# Altium integrated library EFR_Lib.IntLib: 430 symbols (part 3 of 6) (continued)
## LAA710S
designator U?
Double Solid State Relays - PCB Mount Single Pole OptoMOS 1-Form-A, 60V, 1A; Manufacturer: IXYS SEMICONDUCTOR; Height (mm): 4.572; Manufacturer P/N: LAA710S; ComponentLink1Description: Datasheet; ComponentLink1URL: https://www.mouser.de/datasheet/2/240/LAA710-1547779.pdf; Mounting Technology: SMT
footprint SOP254P952X457-8N
part A pins: 1 A, 2 K, 7 S', 8 S
part B pins: 3 A, 4 K, 5 S', 6 S

## LCA710R
designator U?
Solid State Relays - PCB Mount Single Pole OptoMOS 1-Form-A, 60V, 1A; Manufacturer: Ixys Clare; Isolation Voltage: 3.75kV; Case/Pakage: SMD DIP-6; Input Current: 50mA; Onstate Resistance: 500mR; Packageing: Rail/Tube; Load Current: 1A; Lead Free: Lead Free; Manufacturer P/N: LCA710R; Category: Solid State Relais; Max Operating Temp.: 85°; Max Output Voltage: 60V; Min Operating Temp.: -40°; Mounting Technology: SMT; Output Current: 1A; ComponentLink1Description: Maufacturer; ComponentLink1URL: https://www.mouser.de/ProductDetail/IXYS-Integrated-Circuits/LCA710STR?qs=sGAEpiMZZMsUriz2CNI3E0bxyj4gwKaXQYju9WODtmI%3D; ComponentLink2Description: Datasheet; ComponentLink2URL: https://datasheet.ciiva.com/15711/3lca710-15711264.pdf?src-supplier=Onlinecomponents.com; Supplier 1: Mouser; Supplier Part Number 1: 849-LCA710R; Supplier 2: Mouser; Supplier Part Number 2: 849-LCA710RTR
footprint DIP-6_SMD (Footprint not found)
pins: 1 A, 2 K, 3 NC, 4 S', 5 DC, 6 S

## LDK120C33R
designator U?
Linear Voltage Regulator IC 1 Output 200mA SOT-323-5; Manufacturer: STMicroelectronics; Pin Number: 5; Package: SOT-323 STMicroelectronics; Manufacturer P/N: LDK120C33R; ComponentLink1Description: Website; ComponentLink1URL: https://www.st.com/en/power-management/ldk120.html; ComponentLink2Description: Datasheet; ComponentLink2URL: https://www.st.com/resource/en/datasheet/ldk120.pdf; ComponentLink3Description: SnapEDA; ComponentLink3URL: https://www.snapeda.com/parts/LDK120C33R/STMicroelectronics/view-part/1196875/?ref=snap; Mounting Technology: SMT; Supplier 1: Mouser; Supplier Part Number 1: 511-LDK120C33R; Parameter 5: *
footprint SOT65P210X110-5N
pins: 1 IN (in), 2 GND (power), 3 EN (in), 4 BYPM/ADJINC (in), 5 OUT (out)

## LI24_1A85
designator K?, comment LI25-1A85
Reed Relays 100 W 1A 24VDC A NO 1000V; Manufacturer: MEDER electronic (Standex); Manufacturer P/N: LI24-1A85; Pin Number: 4; Mounting Technology: THT; Supplier 1: Mouser; Supplier Part Number 1: 876-LI24-1A85
footprint LI12-1A85
pins: 0 HV-in, 1 HV-out, 2 coil-in, 3 coil-out

## LM397MFX
designator U?
Single General Purpose Voltage Comparator, 5-pin SOT-23; Manufacturer: National Semiconductor; PowerWise: N; PackageTopMarking: C397*XTT; Pin Number: 5; RevisionNote: Component URLs added; PackageReference: MF05A; PackageDescription: Molded SOT-23, .115 x .063 x .040 in Body, 5 Lead, .0375 in Pitch; ComponentLink2Description: LM397 Web Page; ComponentLink2URL: http://www.national.com/pf/LM/LM397.html; DatasheetVersion: Aug-2006; PackageVersion: revD, Aug-2008; ComponentLink3Description: MF05A Package Page; ComponentLink1Description: LM397 Datasheet; ComponentLink1URL: http://www.national.com/ds/LM/LM397.pdf; RoHS: N; CompType: Comparator; ComponentLink3URL: http://www.national.com/packaging/folders/mf05a.html; Manufacturer P/N: LM397MFX; Mounting Technology: SMT
footprint MF05A_M (SOT23, 5-Leads, Body 2.9x1.6mm, Pitch 0.95mm, Lead Span 2.8mm, IPC Low Density)
pins: 1 IN- (in), 2 GND (power), 3 IN+ (in), 4 OUT (out), 5 VS (power)

## LM2776
designator U?
LM2776 Switched Capacitor Inverter; Manufacturer P/N: LM2776DBVR; Manufacturer: Texas Instruments; Pin Number: 6; ComponentLink1Description: Datasheet (Online); ComponentLink1URL: http://www.ti.com/lit/ds/symlink/lm2776.pdf; ComponentLink2Description: Datasheet (Local); ComponentLink2URL: ..\Datasheet\Texas_Instruments\lm2776.pdf; ComponentLink3Description: Datasheet (SVN); ComponentLink3URL: https://teamsvn.elbflorace.de/00_Bibliothek/Libraries/Altium/AltiumLibs/Datasheet/Texas_Instruments/lm2776.pdf; ComponentLink4Description: Manufacturer-Site; ComponentLink4URL: http://www.ti.com/product/LM2776; Package: SOT-23; Mounting Technology: SMT
footprint SOT23-6_N
footprint SOT23-6_M
footprint SOT23-6_L
3D model SOT-23 (PCB3D Model)
pins: 1 VOUT (power) "Negative voltage output", 2 GND (power) "Power supply ground input.", 3 VIN (power) "Power supply positive voltage input", 4 EN (in) "Enable control pin, tie this pin high (EN = 1) for normal operation,and to GND(EN= 0) for shutdown", 5 C1+ "Connect this pin to the positive terminal of the charge-pump capacitor.", 6 C1- "Connect this pin to the negative terminal of the charge-pump capacitor."

## LM3407
designator U?
LM3407350-mA,ConstantCurrentOutputFloatingBuck SwitchingConverterfor High-PowerLEDs; Manufacturer: Texas Instruments; Manufacturer P/N: LM3407MY/NOPB; Pin Number: 8; ComponentLink1Description: Datasheet; ComponentLink1URL: http://www.ti.com/lit/ds/symlink/lm3407.pdf; ComponentLink2Description: Manufacturer; ComponentLink2URL: http://www.ti.com/product/LM3407; ComponentLink3Description: Package Description; ComponentLink3URL: http://www.ti.com/lit/ml/mpds046e/mpds046e.pdf; Mounting Technology: SMT
footprint S-PDSO-G8_N (TI PowerPAD TM Plastic small outline)
footprint S-PDSO-G8_M (TI PowerPAD TM Plastic small outline)
footprint S-PDSO-G8_L (TI PowerPAD TM Plastic small outline)
pins: 1 ISNS "Connect resistor RISNS from this pin to ground for LED current sensing. The current sensing resistor should be placed close to this pin.", 2 DIM "PWM Dimming Control Pin. Applying a logic level PWM signal to this pin controls the intended brightness of the LED string.", 3 EN "Applying logic high to this pin or leaving it openenables the switcher. When pulled low the switcher is disabled and will enter low power shutdown mode", 4 FS "Switching Frequency Setting Pin. Connect resistor RFS from this pin to ground to set the switching frequency.", 5 VIN "Input Voltage Pin. The input voltage should be in the range of 4.5 V to 30 V", 6 VCC "Internal Regulator Output Pin. This pin should be bypassed to ground by a ceramic capacitor with a minimum value of 1 μF.", 7 GND "This pin should be connected to the system ground.", 8 LX "Drain of N-MOSFET Switch. Connect this pin to the output inductor and anode of the Schottky diode.", 9 EP "Thermal Pad (Power Ground). Used to dissipate heat from the package during operation. Must be electrically connected to GND external to the package."

## LMC555
designator U?  Manufacturer P/N: LMC555
Timer CMOS; Manufacturer: Texas Instruments; Rev: =VersionControl_RevNumber; ComponentLink1Description: Datasheet; ComponentLink1URL: http://www.ti.com/lit/ds/symlink/lmc555.pdf; ComponentLink2Description: Manufacturer; ComponentLink2URL: http://www.ti.com/product/LMC555; Mounting Technology: SMT
footprint SOIC-08
pins: 1 GND (power), 2 Trigger (in) "Responsible for transition of the flip-flop from set to reset. The output of the timer depends on the amplitude of the external trigger pulse applied to this pin", 3 Output (out) "Output driven waveform", 4 Reset (in) "Negative pulse applied to this pin to disable or reset the timer. When not used for reset purposes, it should be connected to VCC to avoid false triggering", 5 Control (in) "Control voltage controls the threshold and trigger levels. It determines the pulse width of the output waveform. An external voltage applied to this pin can also be used to modulate the output waveform", 6 Threshold (in) "Compares the voltage applied to the terminal with a reference voltage of 2/3 Vcc. The amplitude of voltage applied to this terminal is responsible for the set state of the flip-flop", 7 Discharge (oc) "Open collector output which discharges a capacitor between intervals (in phase with output). It toggles the output from high to low when voltage reaches 2/3 of the supply voltage", 8 V+ (power)

## LT1167AIS8
designator U?
Single Channel, Precision Operational Amplifier, Low Bias Current IA, 1 MHz Typical GBW, 1.2 V/us Typical SR, 4.6 to 40 V, 8-Pin SOIC (S8-8), Industrial, Pb-Free; Linear Technology Part Number: LT1167; Manufacturer P/N: LT1167AIS8#PBF; Manufacturer: Linear Technology; Is (mA) Typical: 0.9; Channels (#): 1; Vos (mV) Typical: 0.015; Vs Min (V): 4.6; SR (V/us) Typical: 1.2; Vs Max (V): 40; ComponentLink1Description: Manufacturer URL; ComponentLink2Description: Datasheet; RevisionNote: URLs updated; PackageDescription: 8-Pin Plastic Small Outline, Body 4.9 x 3.9 mm, Pitch 1.27 mm; ComponentLink2URL: https://cds.linear.com/docs/en/datasheet/1167fc.pdf; DatasheetVersion: Rev. C; ComponentLink3Description: Package Specification; ComponentLink3URL: https://cds.linear.com/docs/en/packaging/05081610_G_SO8.pdf; PackageVersion: Rev G; PackageReference: LT-S8-8; Mounting Technology: SMT; ComponentLink1URL: https://www.analog.com/en/products/lt1167.html; GBW (MHz) Typical: 1; Type: IA; RoHS: Pb-Free
footprint SOIC-8_L (R_8_ADI)
footprint SOIC-8_N (R_8_ADI)
footprint SOIC-8_M (R_8_ADI)
pins: 1 RG, 2 -IN (in), 3 +IN (in), 4 -VS (power), 5 REF (in), 6 OUTPUT (out), 7 +VS (power), 8 RG

## LT1819IS8
designator IC?
single/dual wide bandwidth, high / slew rate, low noise and distortion operational amplifi ers / with excellent DC performance; Manufacturer: Linear Technology; Manufacturer P/N: LT1819IS8#PBF; Datasheet Link: http://www.farnell.com/datasheets/1692381.pdf; Height: 1.752mm; Supplier Part Number 1: 584-LT1819IS8#PBF; Supplier 1: Mouser; Mounting Technology: SMT
footprint SOIC127P599X175-8N
pins: 1 OUT_A, 2 -IN_A, 3 +IN_A, 4 V-, 5 +IN_B, 6 -IN_B, 7 OUT_B, 8 V+

## LT6015MPS5
designator U?, comment LT6015
Low Power, Over-The-Top / Precision Op Amps / 3.2MHz, 0.8V/μs; Manufacturer: Analog Devices / Linear Technology; Manufacturer P/N: LT6015MPS5; Pin Number: 23; Bandwidth: 3.3MHz; Number of Circuits: 1; Input Bias Current: 2nA; Input Offset Voltage (Vos): 55uV; Operating Supply Current: 325uA; Output Current per Channel: 32mA; ComponentLink1Description: Manufacturer; ComponentLink1URL: https://www.analog.com/en/products/lt6016.html; ComponentLink2Description: Datasheet; ComponentLink2URL: https://www.analog.com/media/en/technical-documentation/data-sheets/601567ff.pdf; Supplier 1: Digi-Key; RoHS: Yes; Category: Amplifiers - Op Amps, Buffer, Instrumentation; Stock 1: 3303; Pricing 1: 1=7,42000, 10=6,70000, 25=6,38880, 100=5,54720, 250=5,29788 (USD); Mounting Technology: SMT; Case/Package: SOT-23-5; Min Operating Temperature: -55°C; Max Operating Temperature: 150°C; Slew Rate: 0.8V/µs; Package Quantity: 500; Packaging: Tape and Reel; Gain Bandwidth Product: 3.3MHz; Number of Amplifiers: 1; RoHS Compliant: Yes; REACH SVHC: No SVHC; Supplier Part Number 1: LT6015MPS5#TRMPBFCT-ND
footprint TSOT-23_L
footprint TSOT-23_N
footprint TSOT-23_M
footprint TSOT-23_MFG
part A pins: 1 OUT (out), 3 +IN (in), 4 -IN (in)
part B pins: 2 V- (power), 5 V+ (power)

## LT6016IMS8
designator U?, comment LT6016
Low Power, Over-The-Top / Precision Op Amps / 3.2MHz, 0.8V/μs; Manufacturer: Analog Devices / Linear Technology; Manufacturer P/N: LT6016IMS8#PBF; Pin Number: 8; Common Mode Rejection Ratio: 100dB; Max Supply Voltage: 50V; Min Supply Voltage: 3V; Min Dual Supply Voltage: 1.5V; Max Dual Supply Voltage: 15V; Number of Elements: 2; Input Offset Voltage (Vos): 50uV; Voltage Gain: 129.54dB; Power Supply Rejection Ratio (PSRR): 110dB; Nominal Supply Current: 315uA; ComponentLink1Description: Manufacturer; ComponentLink1URL: https://www.analog.com/en/products/lt6016.html; ComponentLink2Description: Datasheet; ComponentLink2URL: https://www.analog.com/media/en/technical-documentation/data-sheets/601567ff.pdf; Supplier 1: RSComponents; RoHS: Yes; Category: Amplifiers - Op Amps, Buffer, Instrumentation; Stock 1: 1; Pricing 1: 2=6,30600, 26=4,19000 (USD); Mounting Technology: SMT; Case/Package: MSOP; Min Operating Temperature: -40°C; Max Operating Temperature: 85°C; Package Quantity: 50; Series: *; Technology: BIPOLAR; Supply Current: 315uA; RoHS Compliant: Yes; Lead Free: Lead Free; Supplier Part Number 1: 8516878P
footprint MSOP_8 _L (ADI-RM) (SOP, 8-Leads, Body 3x3mm, Pitch 0.65mm, IPC High Density)
footprint MSOP_8 _N (ADI-RM) (SOP, 8-Leads, Body 3x3mm, Pitch 0.65mm, IPC Medium Density)
footprint MSOP_8 _M (ADI-RM) (SOP, 8-Leads, Body 3x3mm, Pitch 0.65mm, IPC Low Density)
part A pins: 1 OUTA (out), 2 -INA (in), 3 +INA (in)
part B pins: 5 +INB (in), 6 -INB (in), 7 OUTB (out)
part C pins: 4 V- (power), 8 V+ (power)

## LTC2054HS5
designator U?
Single Micropower Zero-Drift Operational Amplifiers; Manufacturer: Analog Devices; Pin Number: 5; Package: SOT-5 Analog Devices; Manufacturer P/N: LTC2054HS5; ComponentLink1Description: Website; ComponentLink1URL: https://www.analog.com/en/products/ltc2054.html; ComponentLink2Description: Datasheet; ComponentLink2URL: https://www.analog.com/media/en/technical-documentation/data-sheets/20545fc.pdf; ComponentLink3Description: SnapEDA; ComponentLink3URL: https://www.snapeda.com/parts/LTC2054HS5%23TRMPBF/Analog+Devices/view-part/?ref=snap; Mounting Technology: SMT; Supplier 1: Mouser; Supplier Part Number 1: 584-LTC2054HS5#TRPBF; Supplier 2: Mouser; Supplier Part Number 2: 584-LTC2054HS5TRMPBF
footprint TSOT-23_L
footprint TSOT-23_N
footprint TSOT-23_M
footprint TSOT-23_MFG
part A pins: 1 OUT (out) "Output", 3 + (in) "Input", 4 - (in) "Input"
part B pins: 2 V- (power) "Ground", 5 V+ (power) "Power terminal"

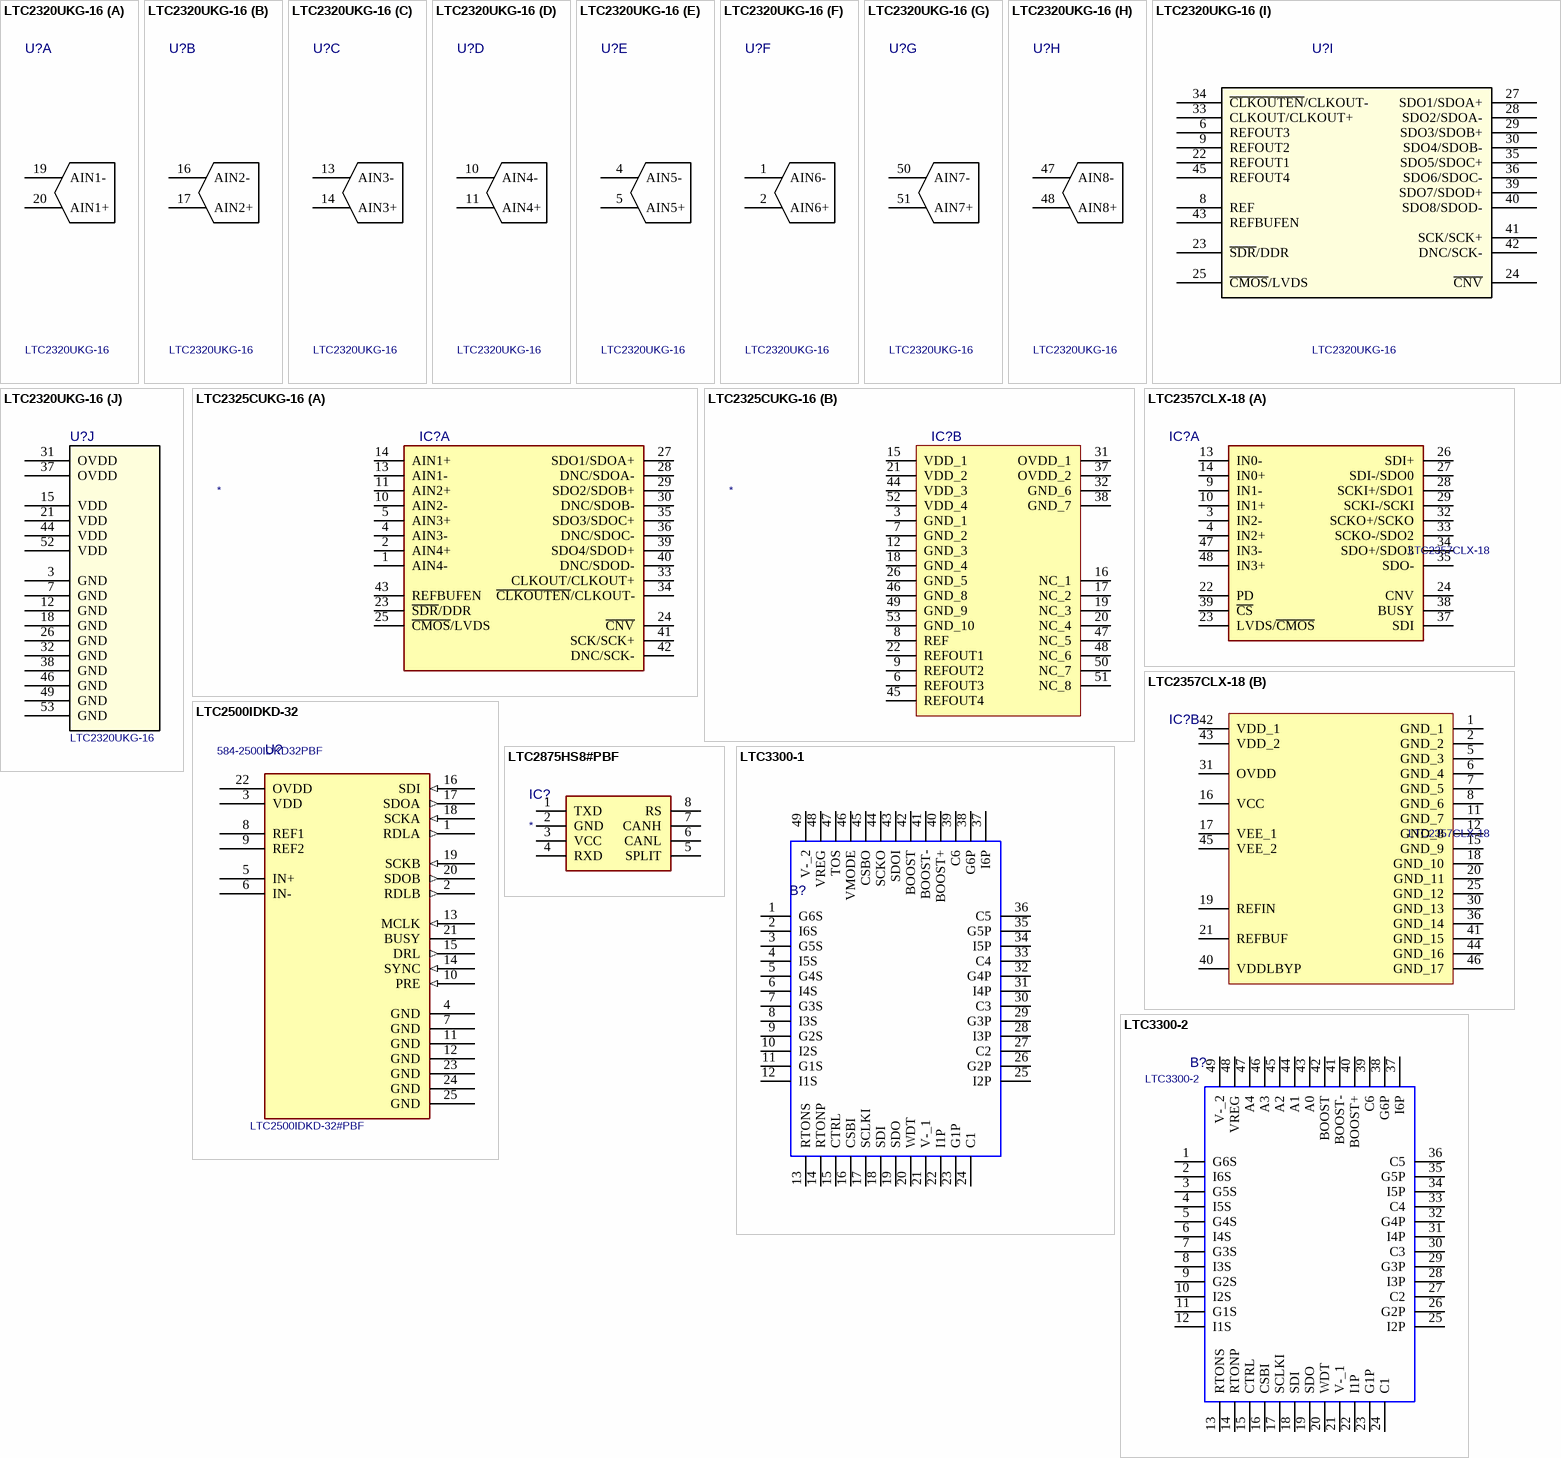
[diagram p13: symbols LTC2320UKG-16 to LTC3300-2]

## LTC2320UKG-16
designator U?
Octal, 16-Bit, 1.5Msps/Ch Simultaneous Sampling ADC; Manufacturer P/N: LTC2320IUKG-16#PBF; Manufacturer: Analog Devices Inc; Mounting Technology: SMT
footprint QFN_52_UKG_L
footprint QFN_52_UKG_N
footprint QFN_52_UKG_M
part A pins: 19 AIN1-, 20 AIN1+
part B pins: 16 AIN2-, 17 AIN2+
part C pins: 13 AIN3-, 14 AIN3+
part D pins: 10 AIN4-, 11 AIN4+
part E pins: 4 AIN5-, 5 AIN5+
part F pins: 1 AIN6-, 2 AIN6+
part G pins: 50 AIN7-, 51 AIN7+
part H pins: 47 AIN8-, 48 AIN8+
part I pins: 6 REFOUT3, 8 REF, 9 REFOUT2, 22 REFOUT1, 23 ~{SDR}/DDR, 24 ~{CNV}, 25 ~{CMOS}/LVDS, 27 SDO1/SDOA+, 28 SDO2/SDOA-, 29 SDO3/SDOB+, 30 SDO4/SDOB-, 33 CLKOUT/CLKOUT+, 34 ~{CLKOUTEN}/CLKOUT-, 35 SDO5/SDOC+, 36 SDO6/SDOC-, 39 SDO7/SDOD+, 40 SDO8/SDOD-, 41 SCK/SCK+, 42 DNC/SCK-, 43 REFBUFEN, 45 REFOUT4
part J pins: 3 GND, 7 GND, 12 GND, 15 VDD, 18 GND, 21 VDD, 26 GND, 31 OVDD, 32 GND, 37 OVDD, 38 GND, 44 VDD, 46 GND, 49 GND, 52 VDD, 53 GND

## LTC2325CUKG-16
designator IC?
low noise, high speed quad 16-bit / successive approximation register (SAR) ADC with / differential inputs and wide input common mode range.; Manufacturer: Analog Devices; Manufacturer P/N: LTC2325CUKG-16#PBF; Datasheet Link: https://www.analog.com/media/en/technical-documentation/data-sheets/232516fa.pdf; Height: 0.8mm; Mouser Part Number: 584-2325CUKG16PBF; Mouser Price/Stock: https://www.mouser.com/Search/Refine.aspx?Keyword=584-2325CUKG16PBF; Mounting Technology: SMT
footprint QFN50P700X800X80-53N-D
part A pins: 1 AIN4-, 2 AIN4+, 4 AIN3-, 5 AIN3+, 10 AIN2-, 11 AIN2+, 13 AIN1-, 14 AIN1+, 23 ~{SDR}/DDR, 24 ~{CNV}, 25 ~{CMOS}/LVDS, 27 SDO1/SDOA+, 28 DNC/SDOA-, 29 SDO2/SDOB+, 30 DNC/SDOB-, 33 CLKOUT/CLKOUT+, 34 ~{CLKOUTEN}/CLKOUT-, 35 SDO3/SDOC+, 36 DNC/SDOC-, 39 SDO4/SDOD+, 40 DNC/SDOD-, 41 SCK/SCK+, 42 DNC/SCK-, 43 REFBUFEN
part B pins: 3 GND_1, 6 REFOUT3, 7 GND_2, 8 REF, 9 REFOUT2, 12 GND_3, 15 VDD_1, 16 NC_1, 17 NC_2, 18 GND_4, 19 NC_3, 20 NC_4, 21 VDD_2, 22 REFOUT1, 26 GND_5, 31 OVDD_1, 32 GND_6, 37 OVDD_2, 38 GND_7, 44 VDD_3, 45 REFOUT4, 46 GND_8, 47 NC_5, 48 NC_6, 49 GND_9, 50 NC_7, 51 NC_8, 52 VDD_4, 53 GND_10

## LTC2357CLX-18
designator IC?
18-bit, low noise 4-channel / simultaneous sampling successive approximation register (SAR) ADC with buffered differential, wide common mode range picoamp inputs; Manufacturer: Analog Devices; Manufacturer P/N: LTC2357CLX-18#PBF; Height (mm): 1.6; Supplier Part Number 1: 584-LTC2357CLX-18PBF; Mounting Technology: SMT; Supplier 1: Mouser; ComponentLink1Description: Datasheet; ComponentLink1URL: https://www.mouser.com/datasheet/2/609/235718f-1266978.pdf
footprint QFP50P900X900X160-48N
part A pins: 3 IN2-, 4 IN2+, 9 IN1-, 10 IN1+, 13 IN0-, 14 IN0+, 22 PD, 23 LVDS/~{CMOS}, 24 CNV, 26 SDI+, 27 SDI-/SDO0, 28 SCKI+/SDO1, 29 SCKI-/SCKI, 32 SCKO+/SCKO, 33 SCKO-/SDO2, 34 SDO+/SDO3, 35 SDO-, 37 SDI, 38 BUSY, 39 ~{CS}, 47 IN3-, 48 IN3+
part B pins: 1 GND_1, 2 GND_2, 5 GND_3, 6 GND_4, 7 GND_5, 8 GND_6, 11 GND_7, 12 GND_8, 15 GND_9, 16 VCC, 17 VEE_1, 18 GND_10, 19 REFIN, 20 GND_11, 21 REFBUF, 25 GND_12, 30 GND_13, 31 OVDD, 36 GND_14, 40 VDDLBYP, 41 GND_15, 42 VDD_1, 43 VDD_2, 44 GND_16, 45 VEE_2, 46 GND_17

## LTC2500IDKD-32
designator U?, comment LTC2500IDKD-32#PBF  Supplier Part Number 1: 584-2500IDKD32PBF
1-Channel Single ADC SAR 1Msps 32-bit Serial 24-Pin DFN EP Tube; Manufacturer: Linear Technology; RoHS Compliant: Yes; Supplier 1: Mouser; Manufacturer P/N: LTC2500IDKD-32#PBF; RoHS: Yes; Category: Analog to Digital Converters (ADCs); Stock 1: 2; Pricing 1: 1=79,85000, 10=75,86000, 50=73,86000, 100=73,86000, 1000=73,86000, 10000=73,86000 (USD); ComponentLink1URL: http://www.analog.com/media/en/technical-documentation/data-sheets/250032fb.pdf?src-supplier=Digi-Key; ComponentLink1Description: http://www.analog.com/media/en/technical-documentation/data-sheets/250032fb.pdf?src-supplier=Digi-Key; ComponentLink2Description: Manufacturer; ComponentLink2URL: https://www.analog.com/en/products/ltc2500-32.html; ComponentLink3Description: Datasheet; ComponentLink3URL: https://www.analog.com/media/en/technical-documentation/data-sheets/250032fb.pdf; Mounting Technology: SMT
footprint DFN-24_M (DKD Package 24 Lead Plastic DFN (7mmx4mm))
pins: 1 RDLA (out), 2 RDLB (out), 3 VDD (power), 4 GND (power), 5 IN+ (hiz), 6 IN- (hiz), 7 GND (power), 8 REF1, 9 REF2, 10 PRE (in), 11 GND (power), 12 GND (power), 13 MCLK (in), 14 SYNC (in), 15 DRL (out), 16 SDI (in), 17 SDOA (out), 18 SCKA (in), 19 SCKB (in), 20 SDOB (out), 21 BUSY, 22 OVDD (power), 23 GND (power), 24 GND (power), 25 GND (power)

## LTC2875HS8#PBF
designator IC?
robust high speed, low power CAN / transceiver operating on 3.3V or 5V supplies that features / ±60V overvoltage fault protection; Manufacturer: Linear Technology; Manufacturer P/N: LTC2875HS8#PBF; Height (mm): 1.752; Mounting Technology: SMT; Supplier 1: Mouser; Supplier Part Number 1: 584-LTC2875HS8#PBF; ComponentLink1Description: Datasheet; ComponentLink1URL: http://www.linear.com/docs/46014
footprint SOIC127P599X175-8N
pins: 1 TXD, 2 GND, 3 VCC, 4 RXD, 5 SPLIT, 6 CANL, 7 CANH, 8 RS

## LTC3300-1
designator B?
High Efficiency Bidirectional Multicell Battery Balancer; Manufacturer: Analog Devices; Manufacturer P/N: LTC3300-1; Datasheet Link: http://cds.linear.com/docs/en/datasheet/33001fb.pdf; Height (mm): 1.6; Mounting Technology: SMT
footprint QFP50P900X900X160-49N
pins: 1 G6S, 2 I6S, 3 G5S, 4 I5S, 5 G4S, 6 I4S, 7 G3S, 8 I3S, 9 G2S, 10 I2S, 11 G1S, 12 I1S, 13 RTONS, 14 RTONP, 15 CTRL, 16 CSBI, 17 SCLKI, 18 SDI, 19 SDO, 20 WDT, 21 V-_1, 22 I1P, 23 G1P, 24 C1, 25 I2P, 26 G2P, 27 C2, 28 I3P, 29 G3P, 30 C3, 31 I4P, 32 G4P, 33 C4, 34 I5P, 35 G5P, 36 C5, 37 I6P, 38 G6P, 39 C6, 40 BOOST+, 41 BOOST-, 42 BOOST, 43 SDOI, 44 SCKO, 45 CSBO, 46 VMODE, 47 TOS, 48 VREG, 49 V-_2

## LTC3300-2
designator B?
High Efficiency Bidirectional Multicell Battery Balancer; Manufacturer: Analog Devices; Manufacturer P/N: LTC3300-2; Datasheet Link: http://cds.linear.com/docs/en/datasheet/33001fb.pdf; Height (mm): 1.6; Mounting Technology: SMT
footprint QFP50P900X900X160-49N
pins: 1 G6S, 2 I6S, 3 G5S, 4 I5S, 5 G4S, 6 I4S, 7 G3S, 8 I3S, 9 G2S, 10 I2S, 11 G1S, 12 I1S, 13 RTONS, 14 RTONP, 15 CTRL, 16 CSBI, 17 SCLKI, 18 SDI, 19 SDO, 20 WDT, 21 V-_1, 22 I1P, 23 G1P, 24 C1, 25 I2P, 26 G2P, 27 C2, 28 I3P, 29 G3P, 30 C3, 31 I4P, 32 G4P, 33 C4, 34 I5P, 35 G5P, 36 C5, 37 I6P, 38 G6P, 39 C6, 40 BOOST+, 41 BOOST-, 42 BOOST, 43 A0, 44 A1, 45 A2, 46 A3, 47 A4, 48 VREG, 49 V-_2

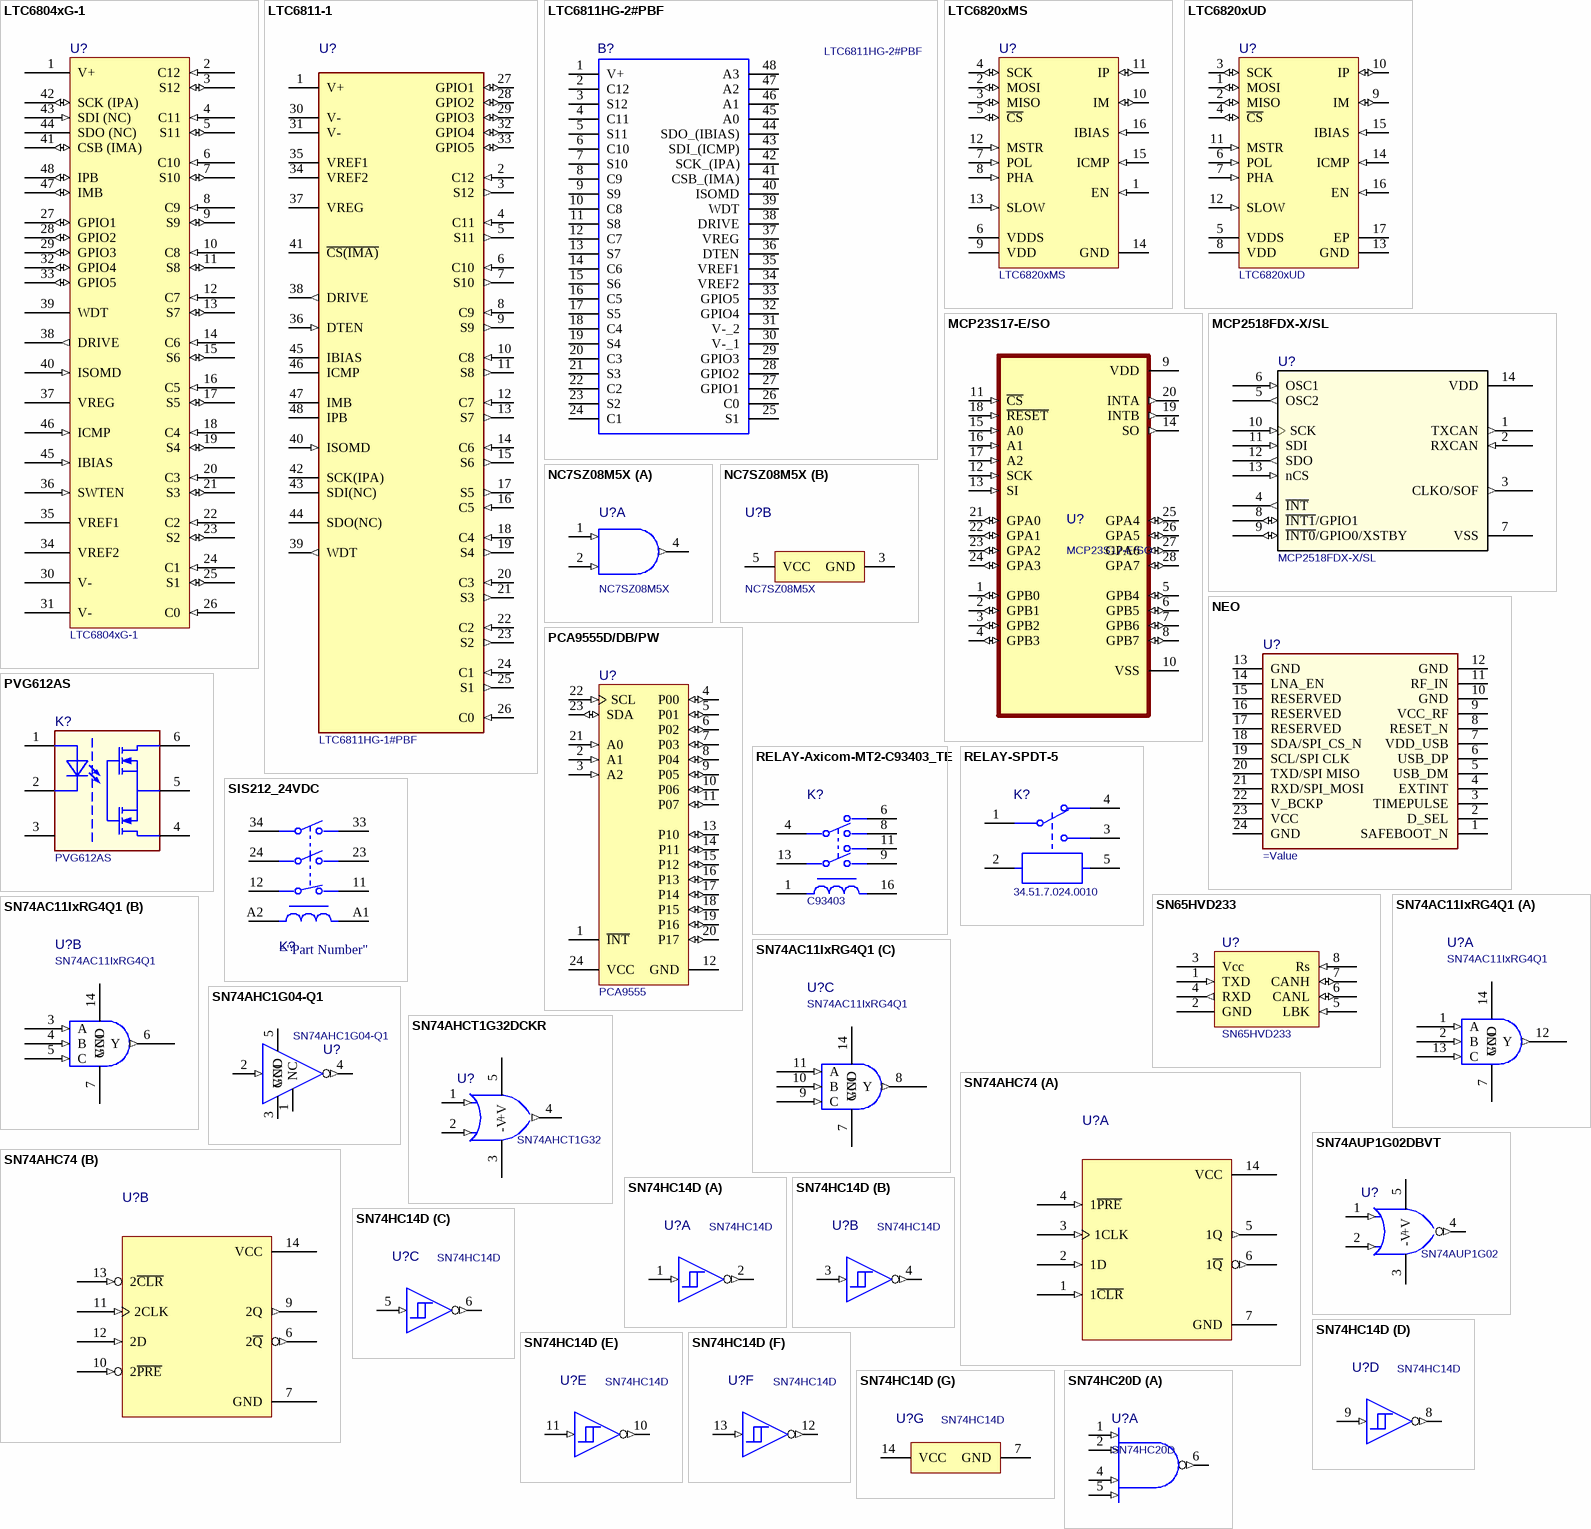
[diagram p14: symbols LTC6804xG-1 to SN74HC20D]

## LTC6804xG-1
designator U?
Battery Monitoring Li-Ion 5.6V Automotive 48-Pin SSOP Tube; Manufacturer: Analog Devices / Linear Technology; Pin Number: 48; Interface: I2C,SPI; Number of Batteries: 12; Max Input Voltage: 60V; Min Supply Voltage: 4.5V; Max Supply Voltage: 5.5V; Manufacturer P/N: LTC6804xG-1; RoHS: Yes; Category: Battery Management; Pricing 1: 1=29,93000, 5=28,77000, 10=27,60000, 25=26,36000, 50=24,97000, 100=23,57000, 250=22,49000 (USD); Case/Package: G; Min Operating Temperature: -40°C; Max Operating Temperature: 125°C; Package Quantity: 37; Packaging: Rail/Tube; RoHS Compliant: Yes; REACH SVHC: No SVHC; ComponentLink1URL: https://datasheet.ciiva.com/22725/1780638-22725285.pdf?src-supplier=Element14; ComponentLink1Description: https://datasheet.ciiva.com/22725/1780638-22725285.pdf?src-supplier=Element14; ComponentLink2URL: https://datasheet.ciiva.com/18617/43171-18617607.pdf?src-supplier=Digi-Key; ComponentLink2Description: https://datasheet.ciiva.com/18617/43171-18617607.pdf?src-supplier=Digi-Key; ComponentLink3URL: https://datasheet.ciiva.com/22802/1780638-22802890.pdf?src-supplier=Farnell; ComponentLink3Description: https://datasheet.ciiva.com/22802/1780638-22802890.pdf?src-supplier=Farnell; Supplier 1: Mouser; Supplier 2: Digi-Key; Supplier 3: Farnell; Supplier 4: Newark; Supplier Part Number 1: 584-LTC6804HG-1#PBF; Supplier Part Number 2: 505-LTC6804HG-1#PBF-ND; Supplier Part Number 3: 2354420; Supplier Part Number 4: 50AK3973; Mounting Technology: SMT
footprint FP-G-48-05-08-1887-IPC_A
footprint FP-G-48-05-08-1887-IPC_B
footprint FP-G-48-05-08-1887-IPC_C
footprint FP-G-48-05-08-1887-MFG
pins: 1 V+ (power) "Positive Supply Pin.", 2 C12 (in) "Cell Inputs.", 3 S12 (io) "Balance Inputs/Outputs. 12 N-MOSFETs are connected between S(n) and C(n - 1) for discharging cells.", 4 C11 (in) "Cell Inputs.", 5 S11 (io) "Balance Inputs/Outputs. 12 N-MOSFETs are connected between S(n) and C(n - 1) for discharging cells.", 6 C10 (in) "Cell Inputs.", 7 S10 (io) "Balance Inputs/Outputs. 12 N-MOSFETs are connected between S(n) and C(n - 1) for discharging cells.", 8 C9 (in) "Cell Inputs.", 9 S9 (io) "Balance Inputs/Outputs. 12 N-MOSFETs are connected between S(n) and C(n - 1) for discharging cells.", 10 C8 (in) "Cell Inputs.", 11 S8 (io) "Balance Inputs/Outputs. 12 N-MOSFETs are connected between S(n) and C(n - 1) for discharging cells.", 12 C7 (in) "Cell Inputs.", 13 S7 (io) "Balance Inputs/Outputs. 12 N-MOSFETs are connected between S(n) and C(n - 1) for discharging cells.", 14 C6 (in) "Cell Inputs.", 15 S6 (io) "Balance Inputs/Outputs. 12 N-MOSFETs are connected between S(n) and C(n - 1) for discharging cells.", 16 C5 (in) "Cell Inputs.", 17 S5 (io) "Balance Inputs/Outputs. 12 N-MOSFETs are connected between S(n) and C(n - 1) for discharging cells.", 18 C4 (in) "Cell Inputs.", 19 S4 (io) "Balance Inputs/Outputs. 12 N-MOSFETs are connected between S(n) and C(n - 1) for discharging cells.", 20 C3 (in) "Cell Inputs.", 21 S3 (io) "Balance Inputs/Outputs. 12 N-MOSFETs are connected between S(n) and C(n - 1) for discharging cells.", 22 C2 (in) "Cell Inputs.", 23 S2 (io) "Balance Inputs/Outputs. 12 N-MOSFETs are connected between S(n) and C(n - 1) for discharging cells.", 24 C1 (in) "Cell Inputs.", 25 S1 (io) "Balance Inputs/Outputs. 12 N-MOSFETs are connected between S(n) and C(n - 1) for discharging cells.", 26 C0 (in) "Cell Inputs.", 27 GPIO1 (io) "General Purpose I/O. Can be used as digital inputs or digital outputs, or as analog inputs with a measurement range from V- to 5V.", 28 GPIO2 (io) "General Purpose I/O. Can be used as digital inputs or digital outputs, or as analog inputs with a measurement range from V- to 5V.", 29 GPIO3 (io) "General Purpose I/O. Can be used as digital inputs or digital outputs, or as analog inputs with a measurement range from V- to 5V. GPIO [3:5] can be used as an I2C or SPI port.", 30 V- (power) "Negative Supply Pins. The V- pins must be shorted together, external to the IC.", 31 V- (power) "Negative Supply Pins. The V- pins must be shorted together, external to the IC.", 32 GPIO4 (io) "General Purpose I/O. Can be used as digital inputs or digital outputs, or as analog inputs with a measurement range from V- to 5V. GPIO [3:5] can be used as an I2C or SPI port.", 33 GPIO5 (io) "General Purpose I/O. Can be used as digital inputs or digital outputs, or as analog inputs with a measurement range from V- to 5V. GPIO [3:5] can be used as an I2C or SPI port.", 34 VREF2 "Buffered 2nd reference voltage for driving multiple 10k thermistors. Bypass with an external 1uF capacitor.", 35 VREF1 "ADC Reference Voltage. Bypass with an external 1uF capacitor. No DC loads allowed.", 36 SWTEN (in) "Software Timer Enable. Connect this pin to VREG to enable the software timer.", 37 VREG (power) "5V Regulator Input. Bypass with an external 1uF capacitor.", 38 DRIVE (out) "Connect the base of an NPN to this pin. Connect the collector to V+ and the emitter to VREG.", 39 WDT (hiz) "Watchdog Timer Output Pin. This is an open drain NMOS digital output. It can be left unconnected or connected with a 1M resistor to VREG. If the LTC6804 does not receive a valid command within 2 seconds, the watchdog timer (See Datasheet)", 40 ISOMD (in) "Serial Interface Mode. Connecting ISOMD to VREG configures Pins 41 to 44 of the LTC6804 for 2-wire isolated interface (isoSPI) mode. Connecting ISOMD to V- configures the LTC6804 for 4-wire SPI mode.", 41 CSB (IMA) (io), 42 SCK (IPA) (io), 43 SDI (NC) (in), 44 SDO (NC) (oc), 45 IBIAS (in) "Isolated Interface Current Bias. Tie IBIAS to V- through a resistor divider to set the interface output current level. When the isoSPI interface is enabled, the IBIAS pin voltage is 2V. The IPA/IMA or IPB/IMB output current (See Datasheet)", 46 ICMP (in) "Isolated Interface Comparator Voltage Threshold Set. Tie this pin to the resistor divider between IBIAS and V- to set the voltage threshold of the isoSPI receiver comparators. The comparator thresholds are set to 1/2 the (See Datasheet)", 47 IMB (io) "Isolated 2-Wire Serial Interface Port B. IMB (minus) are a differential input/output pair.", 48 IPB (io) "Isolated 2-Wire Serial Interface Port B. IPB (plus) are a differential input/output pair."

## LTC6811-1
designator U?, comment LTC6811HG-1#PBF
IC MONITOR BATT STACK 48SSOP; Manufacturer: Analog Devices; Max Supply Voltage: 55V; Min Supply Voltage: 4.5V; Standoff Height: 0.05mm; Number Of Cells: 12; Max Junction Temp: +150°C; Lead Free: Yes; Automotive: No; Temperature Range High: +125°C; RoHS: TRUE; Device Class L3: Battery Management; Height (mm): 2; Device Class L1: Integrated Circuits (ICs); Digikey Description: IC MONITOR BATT STACK 48SSOP; Device Class L2: Power Management ICs; Mouser Description: Sc-Automotive Multicell Battery Stack Monitor With Addressable Isospi Interface; Temperature Range Low: -40°C; Category: IC; Temperature: -40°C to +125°C; Package: G-48-05-08-1887; Manufacturer P/N: LTC6811HG-1#PBF; ComponentLink3Description: Website; ComponentLink3URL: https://www.analog.com/en/products/ltc6811-1.html; ComponentLink4Description: Datasheet; ComponentLink4URL: https://www.analog.com/media/en/technical-documentation/data-sheets/68111fb.pdf; ComponentLink5Description: Octopart; ComponentLink5URL: https://octopart.com/ltc6811hg-1%23pbf-analog+devices-88968888; Supplier 1: Mouser; Supplier Part Number 1: 584-LTC6811HG-1#PBF; Supplier 2: Mouser; Supplier Part Number 2: 584-LTC6811HG-1TRPBF; Mounting Technology: SMT
footprint FP-G-48-05-08-1887-IPC_A
footprint FP-G-48-05-08-1887-IPC_B
footprint FP-G-48-05-08-1887-IPC_C
footprint FP-G-48-05-08-1887-MFG
pins: 1 V+ (power), 2 C12 (in), 3 S12 (out), 4 C11 (in), 5 S11 (out), 6 C10 (in), 7 S10 (out), 8 C9 (in), 9 S9 (out), 10 C8 (in), 11 S8 (out), 12 C7 (in), 13 S7 (out), 14 C6 (in), 15 S6 (out), 16 C5 (in), 17 S5 (out), 18 C4 (in), 19 S4 (out), 20 C3 (in), 21 S3 (out), 22 C2 (in), 23 S2 (out), 24 C1 (in), 25 S1 (out), 26 C0 (in), 27 GPIO1 (io), 28 GPIO2 (io), 29 GPIO3 (io), 30 V- (power), 31 V- (power), 32 GPIO4 (io), 33 GPIO5 (io), 34 VREF2 (power), 35 VREF1 (power), 36 DTEN (in), 37 VREG (power), 38 DRIVE (out), 39 WDT (out), 40 ISOMD (in), 41 ~{CS(IMA)}, 42 SCK(IPA), 43 SDI(NC), 44 SDO(NC), 45 IBIAS, 46 ICMP, 47 IMB, 48 IPB

## LTC6811HG-2#PBF
designator B?
Multicell Battery Balancer Automotive 48-Pin SSOP Tube; Manufacturer: Analog Devices; Manufacturer P/N: LTC6811HG-2#PBF; Mounting Technology: SMT; Height (mm): 2; Supplier 1: Mouser; Supplier Part Number 1: 584-LTC6811HG-2#PBF; Supplier 2: Mouser; Supplier Part Number 2: 584-LTC6811HG-2TRPBF; ComponentLink1Description: Website; ComponentLink1URL: https://www.analog.com/en/products/ltc6811-2.html; ComponentLink2Description: Datasheet; ComponentLink2URL: https://www.analog.com/media/en/technical-documentation/data-sheets/LTC6811-1-6811-2.pdf
footprint SOP50P780X200-48N
pins: 1 V+, 2 C12, 3 S12, 4 C11, 5 S11, 6 C10, 7 S10, 8 C9, 9 S9, 10 C8, 11 S8, 12 C7, 13 S7, 14 C6, 15 S6, 16 C5, 17 S5, 18 C4, 19 S4, 20 C3, 21 S3, 22 C2, 23 S2, 24 C1, 25 S1, 26 C0, 27 GPIO1, 28 GPIO2, 29 GPIO3, 30 V-_1, 31 V-_2, 32 GPIO4, 33 GPIO5, 34 VREF2, 35 VREF1, 36 DTEN, 37 VREG, 38 DRIVE, 39 WDT, 40 ISOMD, 41 CSB_(IMA), 42 SCK_(IPA), 43 SDI_(ICMP), 44 SDO_(IBIAS), 45 A0, 46 A1, 47 A2, 48 A3

## LTC6820xMS
designator U?
IsoSPI Isolated Communication Interface, 2.7 to 5.5 V, -40 to 125 degC, 16-Pin MSOP (MS), Pb-Free; Manufacturer: Linear Technology; IO Supply Current: 1 uA Max.; IO Supply Voltage Range: 1.7 to 5.5 V; Receiver Input Resistance: 35 kOhm; VBIAS: 1.9 to 2.1 V; Supply Current, IDLE State: 2 uA; Mounting Technology: SMT; ComponentLink2URL: https://www.analog.com/media/en/technical-documentation/data-sheets/LTC6820.pdf; PackageVersion: Rev. A; PackageReference: MS-16; PackageDescription: 16-Pin Micro Small Outline Package, Body 4.039 x 3 mm, Pitch 0.5 mm; DatasheetVersion: Rev. A; Power Supply: 2.7 to 5.5 V; ComponentLink1Description: Manufacturer URL; Manufacturer P/N: LTC6820xMS; Temperature Range (degC): -40 to 125; ComponentLink1URL: https://www.analog.com/en/products/ltc6820.html; ComponentLink2Description: Datasheet; Supplier 1: Mouser; Supplier Part Number 1: 584-LTC6820IMS#PBF; Supplier 2: Mouser; Supplier Part Number 2: 584-LTC6820HMS#PBF
footprint MSOP16_M (LT-MS-16) (SOP, 16-Leads, Body 4.04x3.00mm, Pitch 0.50mm, IPC Low Density)
footprint MSOP16_N (LT-MS-16) (Footprint not found)
footprint MSOP16_L (LT-MS-16) (SOP, 16-Leads, Body 4.04x3.00mm, Pitch 0.50mm, IPC High Density)
pins: 1 EN (in) "Device Enable Input. If high, this pin forces the LTC6820 to stay enabled, overriding the internal IDLE mode function. If low, the LTC6820 will go into IDLE mode after the C\S\ pin has been high for 5.7ms (when MSTR pin is high) or after no signal on the IP/IM pins for 5.7ms (when MSTR pin is low). The LTC6820 will wake-up less than 8us after C\S\ falls (MSTR high) or after a signal is detected on IP/IM (MSTR low).", 2 MOSI (io) "SPI Master Out/Slave In Data. If connected on the master side of a SPI interface (MSTR pin high), this pin receives the data signal output from the master SPI controller. If connected on the slave side of the interface (MSTR pin low), this pin drives the data signal input to the slave SPI device. The output is open drain, so an external pull-up resistor to VDDS is required.", 3 MISO (io) "SPI Master Out/Slave In Data. If connected on themaster side of a SPI interface (MSTR pin high), this pin receives the data signal output from the master SPI controller. If connected on the slave side of the interface (MSTR pin low), this pin drives the data signal input to the slave SPI device. The output is open drain, so an external pull-up resistor to VDDS is required.", 4 SCK (io) "SPI Clock Input/Output. If connected on the master side of the interface (MSTR pin high), this pin receives the clock signal from the master SPI controller. This input should not be pulled above VDDS. If connected on the slave side of the interface (MSTR pin low), this pin outputs the clock signal to the slave device. The output driver is push-pull; no external pull-up resistor is needed.", 5 ~{CS} (io) "SPI Chip Select Input/Output. If connected on the masterside ofthe interface (MSTR pin high), this pin receivesthe chip select signal from the master SPI controller. This input should not be pulled above VDDS. Ifconnected on the slave side of the interface (MSTR pin low), this pin outputs the chip select signal to the slave device. The output driver is push-pull; no external pull-up resistor is needed.", 6 VDDS (power) "SPI Input/Output Power Supply Input.The output drivers for the SCK and C\S\ pins use the VDDS input as their positive power supply. The input threshold voltages of SCK, C\S\, MOSI, MISO and EN are determined by VDDS. May be tied to VDD or to a supply above or below VDD to level shift the SPI I/O. If separate from VDD, connect a bypass capacitor of at least 0.01 pF directly between VDDS amd GND", 7 POL (in) "SPI Clock Polarity Input. Tie to VDD or GND. See Operation section for details.", 8 PHA (in) "SPI Clock Phase Input. Tie to VDD orGND. See Operation section for details.", 9 VDD (power) "Device Power Supply Input. Connect a bypass capacitor of at least 0.01uF directly between VDD and GND.", 10 IM (io) "Isolated Interface Minus Input/Output.", 11 IP (io) "Isolated Interface Plus Input/Output.", 12 MSTR (in) "Serial Interface Master/Slave Selector Input. Tie this pin to VDD if the device is on the master side of the isolated interface. Tie this pin to GND if the device is on the slave side of the isolated interface", 13 SLOW (in) "Slow Interface Selection Input. For clock frequencies at or below 200kHz, or if slave devices cannot meet timing requirements, this pin should be tied to VDD. For clock frequencies above 200kHz, this pin should be tied to GND.", 14 GND (power) "Device Ground.", 15 ICMP (in) "Isolated Interface Comparator Voltage Threshold Set. Tie this pin to the resistor divider between IBIAS and GND to set the voltage threshold of the interface receiver comparators. The comparator thresholds are set to 1/2 the voltage on the ICMP pin.", 16 IBIAS (in) "Isolated Interface Current Bias. Tie IBIAS to GND through a resistor divider to set the interface output current level.When the device is enabled, this pin is approximately 2V. When transmitting pulses, the sink current on each of the IP and IM pins is set to 20 times the current sourced from pin IBIAS to GND. Limit the capacitance on the IBIAS pin to less than 50pF to maintain the stability of the feedback circuit regulating the IBIAS voltage."